# Altium footprint library Elettronica FM.PcbLib: 387 footprints (part 6 of 25)
Each footprint in its own frame and in the unit in brackets; x right, y up, seen from the top. Pads: shape width x height; smd on the part's side, far side on the other; paste and mask are expansions set on the pad; w line width, h text height; cw(c..) or ccw(c..) is an arc to the next point about the centre after c.
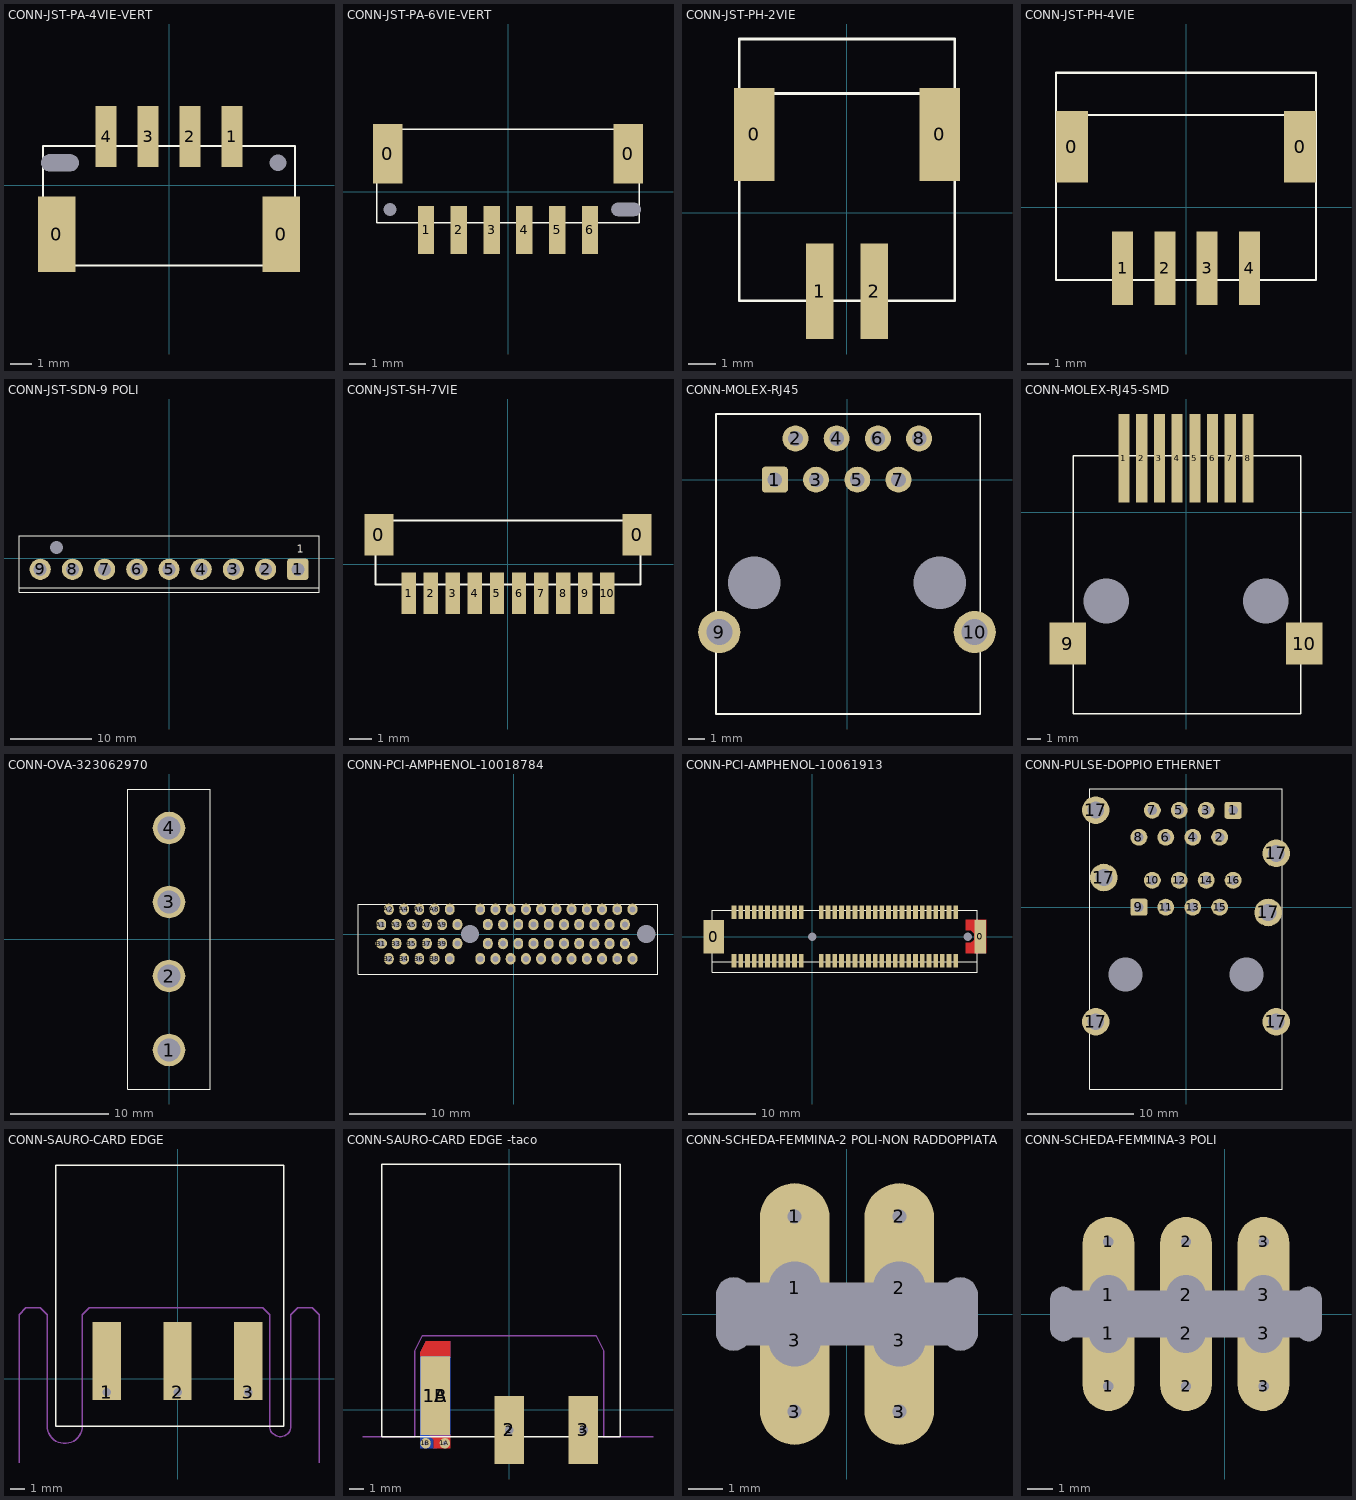
[diagram p5: the footprints below, top view; thin cyan lines are the x and y axes]

## CONN-JST-PA-4VIE-VERT [mm]
height 16.6
pads (8):
  rect 1.8x3.6 smd: 0(-5.35,-2.325) 0(5.35,-2.325)
  round 0 hole 0.8 slot 1.8 at 0 deg unplated: 0(-5.2,1.075)
  round 0 hole 0.8 unplated: 0(5.2,1.075)
  rect 1x2.9 smd: 1(3,2.325) 2(1,2.325) 3(-1,2.325) 4(-3,2.325)
Top Overlay:
  lines w0.1: -6,-3.825 6,-3.825 6,1.875 -6,1.875 -6,-3.825
3D body "BM04B-PASS-TF.STEP": height 9, standoff 0, extent -6,-3.825 6,3.275

## CONN-JST-PA-6VIE-VERT [mm]
pads (10):
  rect 1.8x3.6 smd paste-0.051: 0(-7.35,2.325) 0(7.35,2.325)
  round 0 hole 0.8 unplated: 0(-7.2,-1.075)
  round 0 hole 0.8 slot 1.8 at 0 deg unplated: 0(7.2,-1.075)
  rect 1x2.9 smd paste-0.051: 1(-5,-2.325) 2(-3,-2.325) 3(-1,-2.325) 4(1,-2.325) 5(3,-2.325) 6(5,-2.325)
Top Overlay:
  lines w0.1: -8,-1.875 -8,3.825 8,3.825 8,-1.875 -8,-1.875
3D body "BM06B-PASS-TF.STEP": height 9, standoff 0, extent -8,-3.275 8,3.825

## CONN-JST-PH-2VIE [mm]
pads (4):
  rect 1.5x3.4 smd: 0(-3.4,2.875) 0(3.4,2.875)
  rect 1x3.5 smd: 1(-1,-2.875) 2(1,-2.875)
Top Overlay:
  lines w0.1: -3.95,4.375 3.95,4.375 ; -3.95,-3.225 3.95,-3.225 3.95,6.375 -3.95,6.375 -3.95,-3.225
3D body "S2B-PH-SM4-TB.STEP": height 5.5, standoff -0.1, extent -3.95,-4.225 3.95,4.375

## CONN-JST-PH-4VIE [mm]
pads (6):
  rect 1.5x3.4 smd: 0(-5.4,2.875) 0(5.4,2.875)
  rect 1x3.5 smd: 1(-3,-2.875) 2(-1,-2.875) 3(1,-2.875) 4(3,-2.875)
Top Overlay:
  lines w0.1: -6.15,4.375 6.15,4.375 ; -6.15,-3.425 -6.15,6.375 6.15,6.375 6.15,-3.425 -6.15,-3.425
3D body "S4B-PH-SM4-TB.STEP": height 5.5, standoff -0.1, extent -5.95,-4.225 5.95,4.375

## CONN-JST-SDN-9 POLI [mm]
pads (10):
  rrect25% 0x0 hole 1.6 unplated: 0(-13.86,1.35)
  rrect25% 2.6x2.6 hole 1.6: 1(15.84,-1.35)
  round 2.6 hole 1.6: 2(11.88,-1.35) 3(7.92,-1.35) 4(3.96,-1.35) 5(0,-1.35) 6(-3.96,-1.35) 7(-7.92,-1.35) 8(-11.88,-1.35) 9(-15.84,-1.35)
Top Overlay:
  lines w0.1: -18.45,-3.65 18.45,-3.65 ; 18.45,-3.65 18.45,2.75 -18.45,2.75 -18.45,-4.15 18.45,-4.15 18.45,-3.65
  text "1" at 15.725,0.675 h1
3D body: height 7, standoff 0, extent -18.45,-4.15 18.45,2.75

## CONN-JST-SH-7VIE [mm]
pads (12):
  rect 1.3x1.9 smd paste-0.051: 0(-5.85,1.325) 0(5.85,1.325)
  rect 0.65x1.9 smd paste-0.051: 1(-4.5,-1.325) 2(-3.5,-1.325) 3(-2.5,-1.325) 4(-1.5,-1.325) 5(-0.5,-1.325) 6(0.5,-1.325) 7(1.5,-1.325) 8(2.5,-1.325) 9(3.5,-1.325) 10(4.5,-1.325)
Top Overlay:
  lines w0.1: -6,-0.925 -6,1.975 6,1.975 6,-0.925 -6,-0.925
3D body "BM10B-SRSS-TB.STEP": height 4.25, standoff -0.07, extent -6,-1.625 6,1.975

## CONN-MOLEX-RJ45 [mm]
pads (12):
  rect 0x0 hole 3.25 unplated mask+0: 0(-5.715,-6.35) 0(5.715,-6.35)
  rrect25% 1.6x1.6 hole 0.9 mask+0.1: 1(-4.445,0)
  round 1.6 hole 0.9 mask+0.1: 2(-3.175,2.54) 3(-1.905,0) 4(-0.635,2.54) 5(0.635,0) 6(1.905,2.54) 7(3.175,0) 8(4.445,2.54)
  round 2.6 hole 1.6 mask+0: 9(-7.875,-9.4) 10(7.875,-9.4)
Top Overlay:
  lines w0.1: -8.075,-14.45 8.225,-14.45 8.225,4.05 -8.075,4.05 -8.075,-14.45
3D body "955402881.stp": height 11.5, standoff -3.6, extent -8,-14.25 8,3.85

## CONN-MOLEX-RJ45-SMD [mm]
pads (12):
  rect 0x0 hole 3.25 unplated mask+0: 0(-5.715,-6.35) 0(5.715,-6.35)
  rect 0.8x6.35 smd paste+0 mask+0.05: 1(-4.445,3.875) 2(-3.175,3.875) 3(-1.905,3.875) 4(-0.635,3.875) 5(0.635,3.875) 6(1.905,3.875) 7(3.175,3.875) 8(4.445,3.875)
  rect 2.6x3 smd paste+0 mask+0.05: 9(-8.465,-9.4) 10(8.465,-9.4)
Top Overlay:
  lines w0.1: -8.075,-14.45 8.225,-14.45 8.225,4.05 -8.075,4.05 -8.075,-14.45
3D body "955406886.stp": height 11.5, standoff -1.05, extent -9.07,-14.25 9.07,6.33

## CONN-OVA-323062970 [mm]
pads (4):
  round 3.3 hole 2.3: 1(0,-11.25) 2(0,-3.75) 3(0,3.75) 4(0,11.25)
Top Overlay:
  lines w0.1: -4.2,-15.2 4.2,-15.2 4.2,15.2 -4.2,15.2 -4.2,-15.2

## CONN-PCI-AMPHENOL-10018784 [mm]
pads (66):
  round 0 hole 2.4 unplated: 0(-5.75,0) 0(17.4,0)
  oval 1.3x1.5 hole 0.8: A1(-17.4,1.25) A2(-16.4,3.25) A3(-15.4,1.25) A4(-14.4,3.25) A5(-13.4,1.25) A6(-12.4,3.25) A7(-11.4,1.25) A8(-10.4,3.25) A9(-9.4,1.25) A10(-8.4,3.25) A11(-7.4,1.25) A12(-4.4,3.25) A13(-3.4,1.25) A14(-2.4,3.25) A15(-1.4,1.25) A16(-0.4,3.25) A17(0.6,1.25) A18(1.6,3.25) A19(2.6,1.25) A20(3.6,3.25) A21(4.6,1.25) A22(5.6,3.25) A23(6.6,1.25) A24(7.6,3.25) A25(8.6,1.25) A26(9.6,3.25) A27(10.6,1.25) A28(11.6,3.25) A29(12.6,1.25) A30(13.6,3.25) A31(14.6,1.25) A32(15.6,3.25) B2(-16.4,-3.25) B3(-15.4,-1.25) B4(-14.4,-3.25) B5(-13.4,-1.25) B6(-12.4,-3.25) B7(-11.4,-1.25) B8(-10.4,-3.25) B9(-9.4,-1.25) B10(-8.4,-3.25) B11(-7.4,-1.25) B12(-4.4,-3.25) B13(-3.4,-1.25) B14(-2.4,-3.25) B15(-1.4,-1.25) B16(-0.4,-3.25) B17(0.6,-1.25) B18(1.6,-3.25) B19(2.6,-1.25) B20(3.6,-3.25) B21(4.6,-1.25) B22(5.6,-3.25) B23(6.6,-1.25) B24(7.6,-3.25) B25(8.6,-1.25) B26(9.6,-3.25) B27(10.6,-1.25) B28(11.6,-3.25) B29(12.6,-1.25) B30(13.6,-3.25) B31(14.6,-1.25) B32(15.6,-3.25)
  oval 1.5x1.3 hole 0.8: B1(-17.4,-1.25)
Top Overlay:
  lines w0.1: -20.45,-5.3 18.95,-5.3 18.95,3.9 -20.45,3.9 -20.45,-5.3
3D body "10018783-x1xxx_64p.stp": height 11, standoff -4.4, extent -20.25,-5.1 18.75,3.7

## CONN-PCI-AMPHENOL-10061913 [mm]
pads (68):
  rect 3x5 smd: 0(-14.65,0)
  round 0 hole 1.25 unplated: 0(0,0) 0(23.15,0)
  rect 1.75x5 smd: 0(24.975,0)
  rect 0.7x2 smd: A1(-11.65,3.6) A2(-10.65,3.6) A3(-9.65,3.6) A4(-8.65,3.6) A5(-7.65,3.6) A6(-6.65,3.6) A7(-5.65,3.6) A8(-4.65,3.6) A9(-3.65,3.6) A10(-2.65,3.6) A11(-1.65,3.6) A12(1.35,3.6) A13(2.35,3.6) A14(3.35,3.6) A15(4.35,3.6) A16(5.35,3.6) A17(6.35,3.6) A18(7.35,3.6) A19(8.35,3.6) A20(9.35,3.6) A21(10.35,3.6) A22(11.35,3.6) A23(12.35,3.6) A24(13.35,3.6) A25(14.35,3.6) A26(15.35,3.6) A27(16.35,3.6) A28(17.35,3.6) A29(18.35,3.6) A30(19.35,3.6) A31(20.35,3.6) A32(21.35,3.6) B1(-11.65,-3.6) B2(-10.65,-3.6) B3(-9.65,-3.6) B4(-8.65,-3.6) B5(-7.65,-3.6) B6(-6.65,-3.6) B7(-5.65,-3.6) B8(-4.65,-3.6) B9(-3.65,-3.6) B10(-2.65,-3.6) B11(-1.65,-3.6) B12(1.35,-3.6) B13(2.35,-3.6) B14(3.35,-3.6) B15(4.35,-3.6) B16(5.35,-3.6) B17(6.35,-3.6) B18(7.35,-3.6) B19(8.35,-3.6) B20(9.35,-3.6) B21(10.35,-3.6) B22(11.35,-3.6) B23(12.35,-3.6) B24(13.35,-3.6) B25(14.35,-3.6) B26(15.35,-3.6) B27(16.35,-3.6) B28(17.35,-3.6) B29(18.35,-3.6) B30(19.35,-3.6) B31(20.35,-3.6) B32(21.35,-3.6)
Top Layer:
  region: 22.85,2.5 22.85,0.925 23.575,0.925 24.075,0.425 24.075,-0.45 23.6,-0.925 22.85,-0.925 22.85,-2.5 25.85,-2.5 25.85,2.5
Top Overlay:
  lines w0.1: -14.85,-3.7 24.55,-3.7 ; -14.85,-5.3 -14.85,3.925 24.55,3.925 24.55,-5.3 -14.85,-5.3
Top Solder:
  region: 25.95,2.6 22.75,2.6 22.75,0.825 23.525,0.825 23.975,0.375 23.975,-0.4 23.55,-0.825 22.75,-0.825 22.75,-2.6 25.95,-2.6
3D body "10061913-xx1.stp": height 11.1, standoff -0.9, extent -15.7,-5.1 25.3,4.1

## CONN-PULSE-DOPPIO ETHERNET [mm]
pads (24):
  rect 0x0 hole 3.2 unplated mask+0: 0(-5.715,-6.35) 0(5.715,-6.35)
  rrect25% 1.6x1.6 hole 0.9 mask+0.1: 1(4.445,9.14) 9(-4.445,0)
  round 1.6 hole 0.9 mask+0.1: 2(3.175,6.6) 3(1.905,9.14) 4(0.635,6.6) 5(-0.635,9.14) 6(-1.905,6.6) 7(-3.175,9.14) 8(-4.445,6.6) 10(-3.175,2.54) 11(-1.905,0) 12(-0.635,2.54) 13(0.635,0) 14(1.905,2.54) 15(3.175,0) 16(4.445,2.54)
  round 2.6 hole 1.6 mask+0: 17(-8.515,-10.807) 17(-8.515,9.15) 17(-7.755,2.8) 17(7.755,-0.5) 17(8.515,-10.807) 17(8.515,5.08)
Top Overlay:
  lines w0.1: -9.1,-17.15 9.1,-17.15 9.1,11.15 -9.1,11.15 -9.1,-17.15
3D body: height 27.4, standoff 0, extent -9.1,-17.15 9.1,11.15

## CONN-SAURO-CARD EDGE [mm]
pads (3):
  rect 2x5.5 hole 0.6 copper offset 0,2.2: 1(-5,-0.95) 2(0,-0.95) 3(5,-0.95)
Top Overlay:
  lines w0.1: -8.6,-3.325 -8.6,15.075 7.5,15.075 7.5,-3.325 -8.6,-3.325
Mechanical 2:
  lines w0.1: -11.175,-5.9 -11.175,4.525 -10.7,5 -9.675,5 -9.2,4.525 -9.2,-3.3 ccw(c-7.95,-3.3) -6.7,-3.3 -6.7,4.525 -6.225,5 6.025,5 6.5,4.525 6.5,-3.325 ccw(c7.25,-3.325) 8,-3.325 8,4.525 8.475,5 9.5,5 9.975,4.525 9.975,-5.925
3D body "lumberg_3575_07.stp": height 7.21, standoff -2.59, extent -7.379,-1.475 27.521,13.525
3D body "cuf030p1.stp": height 11, standoff -4.5, extent -8.6,-3.325 7.5,15.075

## CONN-SAURO-CARD EDGE -taco [mm]
pads (8):
  rect 2x5.3 smd mask+0.1: 1A(-5,0.95)
  round 0.7 hole 0.3 paste+0 mask-0.15: 1A(-4.35,-2.25) 1B(-5.65,-2.25)
  rect 2x5.3 smd far side mask+0.1: 1B(-5,0.95)
  round 0.9 hole 0.6 paste+0 mask-0.15: 2(0,-1.35) 3(5,-1.35)
  rect 2x4.6 smd: 2(0,-1.35) 3(5,-1.35)
Top Layer:
  region: -4,-1.625 -5.45,-1.625 -5.45,-1.65 -5.1,-2 -5.1,-2.6 -4,-2.6 -4,-1.8
  region: -6,3.525 -4,3.525 -4,4.625 -5.637,4.625 -6,3.9
Bottom Layer:
  region: -4,3.525 -6,3.525 -6,3.9 -5.637,4.625 -4,4.625 -4,3.7
  region: -6,-1.625 -4.55,-1.625 -4.55,-1.65 -4.9,-2 -4.9,-2.6 -6,-2.6 -6,-1.8
Top Overlay:
  lines w0.1: 7.5,-1.8 -8.6,-1.8 -8.6,16.6 7.5,16.6 7.5,-1.775
Top Solder:
  region: -3.9,3.65 -3.9,4.725 -5.713,4.725 -6.1,3.95 -6.1,3.65
  region: -5.5,-1.75 -5.2,-2.05 -5.2,-2.7 -3.9,-2.7 -3.9,-1.9 -3.9,-1.75 -3.9,-1.575 -5.5,-1.575
Bottom Solder:
  region: -3.9,3.65 -3.9,4.725 -5.713,4.725 -6.1,3.95 -6.1,3.65
  region: -4.5,-1.75 -4.5,-1.9 -4.7,-2.1 -4.7,-2.7 -6.1,-2.7 -6.1,-1.9 -6.1,-1.75
  region: -4.7,-1.9 -4.7,-2.7 -6.1,-2.7 -6.1,-1.9
  region: -5.5,-1.75 -5.2,-2.05 -5.2,-2.7 -3.9,-2.7 -3.9,-1.9 -3.9,-1.75 -3.9,-1.575 -5.5,-1.575
Mechanical 2:
  lines w0.1: -9.875,-1.8 -6.375,-1.8 -6.375,4 -5.875,5 5.875,5 6.375,4 6.375,-1.8 9.7,-1.8
3D body "cuf030p1.stp": height 11, standoff -4.5, extent -8.6,-1.8 7.5,16.6

## CONN-SCHEDA-FEMMINA-2 POLI-NON RADDOPPIATA [mm]
height 14.2
pads (16):
  round 0 hole 1 slot 2.1 at 90 deg unplated: 0(-3.25,0) 0(3.25,0)
  round 0 hole 1 slot 7.5 at 0 deg unplated: 0(0,-0.4) 0(0,0.4)
  oval 2x4 hole 1.5 copper offset 0,1: 1(-1.5,0.75) 2(1.5,0.75)
  round 0 hole 0.4: 1(-1.5,2.8) 2(1.5,2.8) 3(-1.5,-2.8) 3(1.5,-2.8)
  round 0.8 hole 0.4: 1(-1.5,2.8) 2(1.5,2.8) 3(-1.5,-2.8) 3(1.5,-2.8)
  oval 2x4 hole 1.5 copper offset 0,-1: 3(-1.5,-0.75) 3(1.5,-0.75)

## CONN-SCHEDA-FEMMINA-3 POLI [mm]
height 14.2
pads (22):
  round 0 hole 1 slot 2.1 at 90 deg unplated: 0(-6.25,0) 0(3.25,0)
  round 0 hole 1 slot 10.5 at 0 deg unplated: 0(-1.5,-0.4) 0(-1.5,0.4)
  round 0 hole 0.4: 1(-4.5,-2.8) 1(-4.5,2.8) 2(-1.5,-2.8) 2(-1.5,2.8) 3(1.5,-2.8) 3(1.5,2.8)
  round 0.8 hole 0.4: 1(-4.5,-2.8) 1(-4.5,2.8) 2(-1.5,-2.8) 2(-1.5,2.8) 3(1.5,-2.8) 3(1.5,2.8)
  oval 2x4 hole 1.5 copper offset 0,-1: 1(-4.5,-0.75) 2(-1.5,-0.75) 3(1.5,-0.75)
  oval 2x4 hole 1.5 copper offset 0,1: 1(-4.5,0.75) 2(-1.5,0.75) 3(1.5,0.75)